# Altium footprint library domino-rising-cage-clamp.PcbLib: 435 footprints (part 25 of 28)
Each footprint in its own frame and in the unit in brackets; x right, y up, seen from the top. Pads: shape width x height; smd on the part's side, far side on the other; paste and mask are expansions set on the pad; w line width, h text height; cw(c..) or ccw(c..) is an arc to the next point about the centre after c.
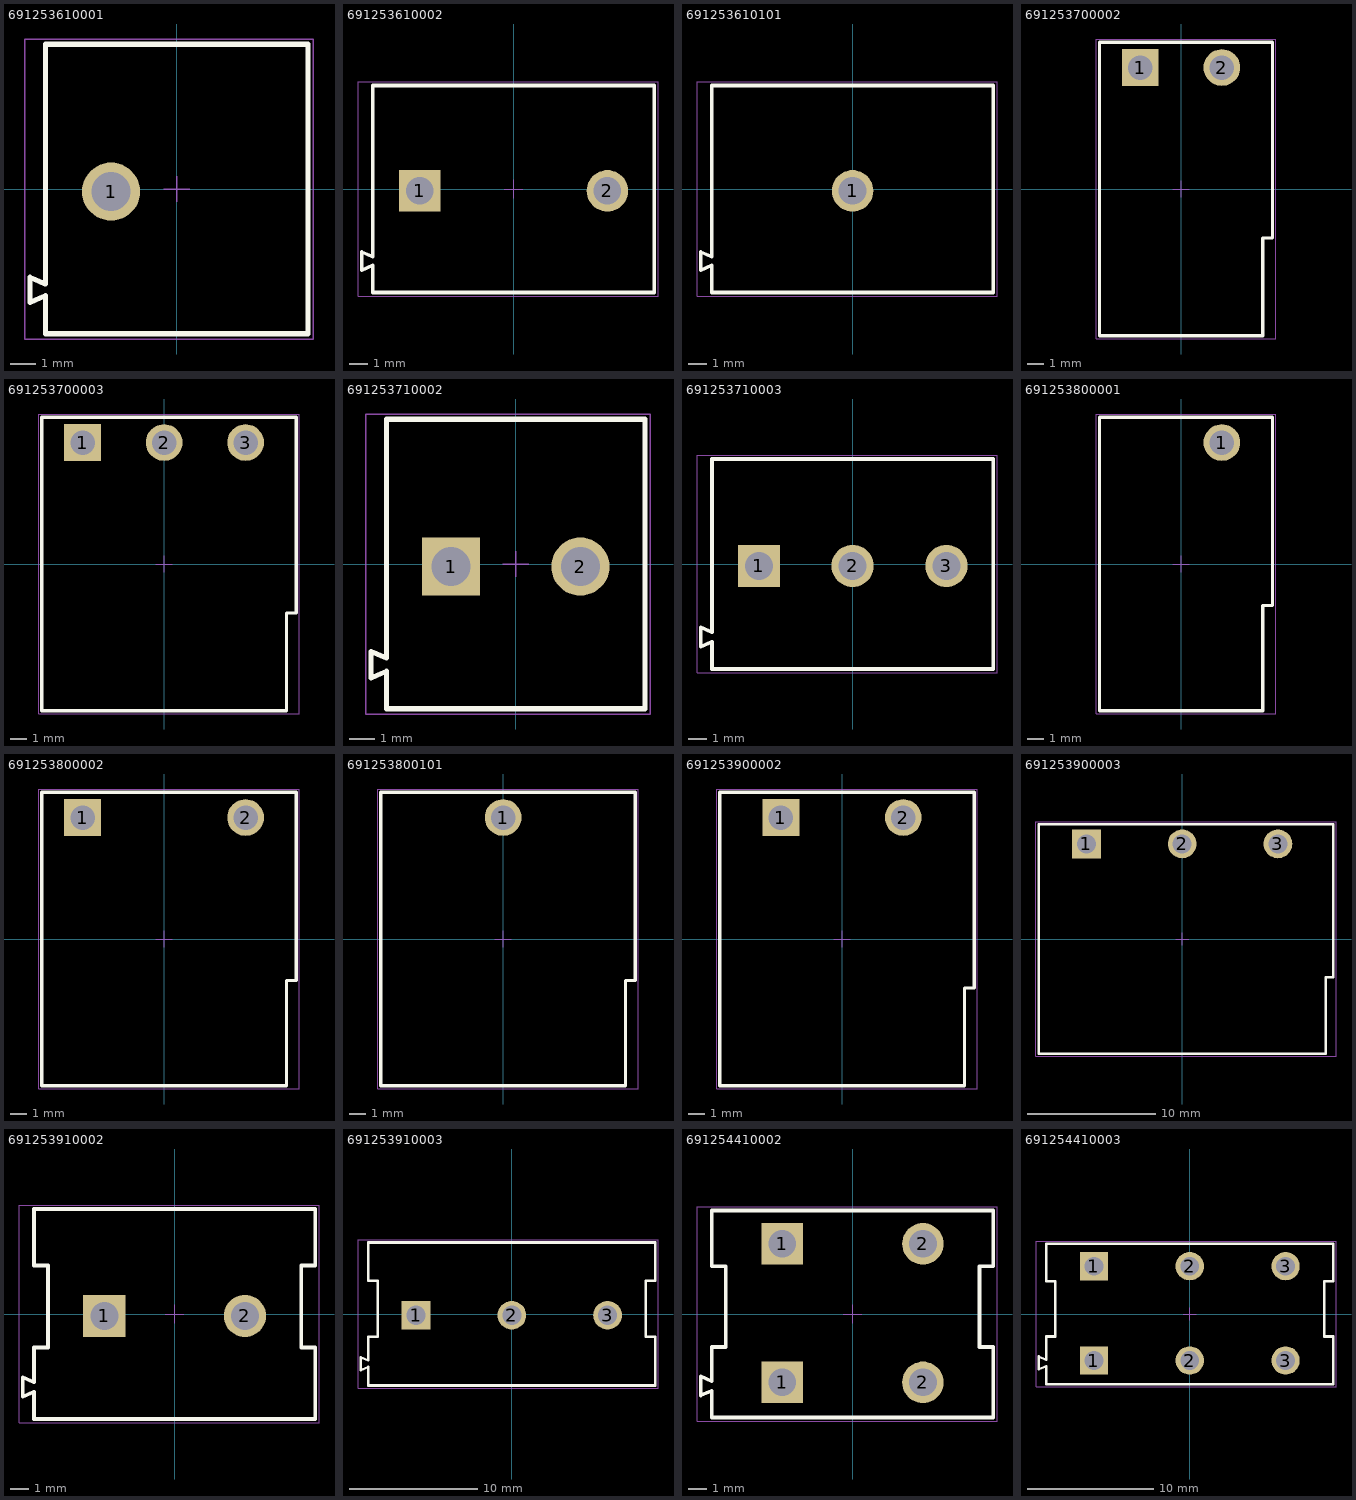
[diagram p24: the footprints below, top view; thin cyan lines are the x and y axes]

## 691253610001 [mm] "Serie 2536 - 10.16 mm _ 1 pins"
height 18
pads (1):
  round 2.25 hole 1.5: 1(-2.54,-0.1)
Top Overlay:
  lines w0.2: -5.079,-4.131 -5.68,-4.39 -5.68,-3.41 -5.079,-3.669 -5.079,5.599 5.08,5.6 5.08,-5.6 -5.08,-5.6 -5.08,-4.13
Mechanical 13:
  lines w0.1: -5.079,-4.131 -5.68,-4.39 -5.68,-3.41 -5.079,-3.669 -5.079,5.599 5.08,5.6 5.08,-5.6 -5.08,-5.6 -5.08,-4.13
Mechanical 15:
  lines w0.05: -0.5,0 0.5,0 ; 0,-0.5 0,0.5 ; -5.88,-5.8 -5.88,5.8 5.28,5.8 5.28,-5.8 -5.88,-5.8
3D body "691253610001.stp": height 18.1, standoff -3.9, extent -5.66,-5.6 5.1,5.6

## 691253610002 [mm] "Serie 2536 - 10.16 mm _ 2 pins"
height 18
pads (2):
  rect 2.25x2.25 hole 1.5: 1(-5.08,-0.1)
  round 2.25 hole 1.5: 2(5.08,-0.1)
Top Overlay:
  lines w0.2: -7.619,-4.131 -8.22,-4.39 -8.22,-3.41 -7.619,-3.669 -7.619,5.599 7.62,5.6 7.62,-5.6 -7.62,-5.6 -7.62,-4.13
Mechanical 13:
  lines w0.1: -7.619,-4.131 -8.22,-4.39 -8.22,-3.41 -7.619,-3.669 -7.619,5.599 7.62,5.6 7.62,-5.6 -7.62,-5.6 -7.62,-4.13
Mechanical 15:
  lines w0.05: -0.5,0 0.5,0 ; 0,-0.5 0,0.5 ; -8.42,-5.8 -8.42,5.8 7.82,5.8 7.82,-5.8 -8.42,-5.8
3D body "691253610002.stp": height 18.1, standoff -3.9, extent -8.2,-5.6 7.64,5.6

## 691253610101 [mm] "Serie 2536 - 10.16 mm _ 1 pin"
height 18
pads (1):
  round 2.25 hole 1.5: 1(0,-0.1)
Top Overlay:
  lines w0.2: -7.619,-4.131 -8.22,-4.39 -8.22,-3.41 -7.619,-3.669 -7.619,5.599 7.62,5.6 7.62,-5.6 -7.62,-5.6 -7.62,-4.13
Mechanical 13:
  lines w0.1: -7.619,-4.131 -8.22,-4.39 -8.22,-3.41 -7.619,-3.669 -7.619,5.599 7.62,5.6 7.62,-5.6 -7.62,-5.6 -7.62,-4.13
Mechanical 15:
  lines w0.05: -0.5,0 0.5,0 ; 0,-0.5 0,0.5 ; -8.42,-5.8 7.82,-5.8 7.82,5.8 -8.42,5.8 -8.42,-5.8
3D body "691253610101.stp": height 18.1, standoff -3.9, extent -8.22,-5.6 7.62,5.6

## 691253700002 [mm] "Serie 2537 - 5.00 mm _ 2 pins"
height 18
pads (2):
  rect 2.25x2.25 hole 1.5: 1(-2.5,7.45)
  round 2.25 hole 1.5: 2(2.5,7.45)
Top Overlay:
  lines w0.2: -5,-9 -5,9 5.6,9 5.6,-3 5,-3 5,-9 -5,-9
Mechanical 13:
  lines w0.1: -5,-9 5,-9 5,-3 5.6,-3 5.6,9 -5,9 -5,-9
Mechanical 15:
  lines w0.05: -0.5,0 0.5,0 ; 0,-0.5 0,0.5 ; -5.2,-9.2 -5.2,9.2 5.8,9.2 5.8,-9.2 -5.2,-9.2
3D body "691253700002.stp": height 11.3, standoff -3.9, extent -5,-9 5.6,9

## 691253700003 [mm] "Serie 2537 - 5.00 mm _ 3 pins"
height 18
pads (3):
  rect 2.25x2.25 hole 1.5: 1(-5,7.45)
  round 2.25 hole 1.5: 2(0,7.45) 3(5,7.45)
Top Overlay:
  lines w0.2: -7.5,-9 7.5,-9 7.5,-3 8.1,-3 8.1,9 -7.5,9 -7.5,-9
Mechanical 13:
  lines w0.1: -7.5,-9 -7.5,9 8.1,9 8.1,-3 7.5,-3 7.5,-9 -7.5,-9
Mechanical 15:
  lines w0.05: -0.5,0 0.5,0 ; 0,-0.5 0,0.5 ; -7.7,-9.2 8.3,-9.2 8.3,9.2 -7.7,9.2 -7.7,-9.2
3D body "691253700003.stp": height 11.3, standoff -3.9, extent -7.5,-9 8.1,9

## 691253710002 [mm] "Serie 2537 - 5.00 mm _ 2 pins"
height 18
pads (2):
  rect 2.25x2.25 hole 1.5: 1(-2.5,-0.1)
  round 2.25 hole 1.5: 2(2.5,-0.1)
Top Overlay:
  lines w0.2: -5.6,-4.41 -5,-4.15 -5,-5.6 5,-5.6 5,5.6 -5,5.6 -5,-3.64 -5.6,-3.38 -5.6,-4.41
Mechanical 13:
  lines w0.1: -5.6,-4.41 -5.6,-3.38 -5,-3.64 -5,5.6 5,5.6 5,-5.6 -5,-5.6 -5,-4.15 -5.6,-4.41
Mechanical 15:
  lines w0.05: -0.5,0 0.5,0 ; 0,-0.5 0,0.5 ; -5.8,-5.8 -5.8,5.8 5.2,5.8 5.2,-5.8 -5.8,-5.8
3D body "691253710002.stp": height 18.1, standoff -3.9, extent -5.6,-5.6 5,5.6

## 691253710003 [mm] "Serie 2537 - 5.00 mm _ 3 pins"
height 18
pads (3):
  rect 2.25x2.25 hole 1.5: 1(-5,-0.1)
  round 2.25 hole 1.5: 2(0,-0.1) 3(5,-0.1)
Top Overlay:
  lines w0.2: -8.1,-4.41 -8.1,-3.38 -7.5,-3.64 -7.5,5.6 7.5,5.6 7.5,-5.6 -7.5,-5.6 -7.5,-4.15 -8.1,-4.41
Mechanical 13:
  lines w0.1: -8.1,-4.41 -7.5,-4.15 -7.5,-5.6 7.5,-5.6 7.5,5.6 -7.5,5.6 -7.5,-3.64 -8.1,-3.38 -8.1,-4.41
Mechanical 15:
  lines w0.05: -0.5,0 0.5,0 ; 0,-0.5 0,0.5 ; -8.3,-5.8 7.7,-5.8 7.7,5.8 -8.3,5.8 -8.3,-5.8
3D body "691253710003.stp": height 18.1, standoff -3.9, extent -8.1,-5.6 7.5,5.6

## 691253800001 [mm] "Serie 2538 - 10.00 mm _ 1 pin"
height 11.2
pads (1):
  round 2.25 hole 1.5: 1(2.5,7.45)
Top Overlay:
  lines w0.2: -5,-9 -5,9 5.6,9 5.6,-2.55 5,-2.55 5,-9 -5,-9
Mechanical 13:
  lines w0.1: -5,-9 5,-9 5,-2.55 5.6,-2.55 5.6,9 -5,9 -5,-9
Mechanical 15:
  lines w0.05: -0.5,0 0.5,0 ; 0,-0.5 0,0.5 ; -5.2,-9.2 5.8,-9.2 5.8,9.2 -5.2,9.2 -5.2,-9.2
3D body "691253800001.stp": height 11.35, standoff -3.85, extent -5,-9 5.6,9

## 691253800002 [mm] "Serie 2538 - 10.00 mm _ 2 pins"
height 11.2
pads (2):
  rect 2.25x2.25 hole 1.5: 1(-5,7.45)
  round 2.25 hole 1.5: 2(5,7.45)
Top Overlay:
  lines w0.2: -7.5,-9 -7.5,9 8.1,9 8.1,-2.55 7.5,-2.55 7.5,-9 -7.5,-9
Mechanical 13:
  lines w0.1: -7.5,-9 7.5,-9 7.5,-2.55 8.1,-2.55 8.1,9 -7.5,9 -7.5,-9
Mechanical 15:
  lines w0.05: -0.5,0 0.5,0 ; 0,-0.5 0,0.5 ; -7.7,-9.2 8.3,-9.2 8.3,9.2 -7.7,9.2 -7.7,-9.2
3D body "691253800002.stp": height 11.35, standoff -3.85, extent -7.5,-9 8.1,9

## 691253800101 [mm] "Serie 2538 - 10.00 mm _ 1 pin"
height 11.2
pads (1):
  round 2.25 hole 1.5: 1(0,7.45)
Top Overlay:
  lines w0.2: -7.5,-9 -7.5,9 8.1,9 8.1,-2.55 7.5,-2.55 7.5,-9 -7.5,-9
Mechanical 13:
  lines w0.1: -7.5,-9 7.5,-9 7.5,-2.55 8.1,-2.55 8.1,9 -7.5,9 -7.5,-9
Mechanical 15:
  lines w0.05: -0.5,0 0.5,0 ; 0,-0.5 0,0.5 ; -7.7,-9.2 8.3,-9.2 8.3,9.2 -7.7,9.2 -7.7,-9.2
3D body "691253800101.stp": height 11.35, standoff -3.85, extent -7.5,-9 8.1,9

## 691253900002 [mm] "Serie 2539 - 7.50 mm _ 2 pins"
height 11.2
pads (2):
  rect 2.25x2.25 hole 1.5: 1(-3.75,7.45)
  round 2.25 hole 1.5: 2(3.75,7.45)
Top Overlay:
  lines w0.2: -7.5,-9 -7.5,9 8.1,9 8.1,-3 7.5,-3 7.5,-9 -7.5,-9
Mechanical 13:
  lines w0.1: -7.5,-9 7.5,-9 7.5,-3 8.1,-3 8.1,9 -7.5,9 -7.5,-9
Mechanical 15:
  lines w0.05: -0.5,0 0.5,0 ; 0,-0.5 0,0.5 ; -7.7,-9.2 -7.7,9.2 8.3,9.2 8.3,-9.2 -7.7,-9.2
3D body "691253900002.stp": height 11.35, standoff -3.85, extent -7.5,-9 8.1,9

## 691253900003 [mm] "Serie 2539 - 7.50 mm _ 3 pins"
height 11.2
pads (3):
  rect 2.25x2.25 hole 1.5: 1(-7.5,7.45)
  round 2.25 hole 1.5: 2(0,7.45) 3(7.5,7.45)
Top Overlay:
  lines w0.2: -11.25,-9 11.25,-9 11.25,-3 11.85,-3 11.85,9 -11.25,9 -11.25,-9
Mechanical 13:
  lines w0.1: -11.25,-9 -11.25,9 11.85,9 11.85,-3 11.25,-3 11.25,-9 -11.25,-9
Mechanical 15:
  lines w0.05: -0.5,0 0.5,0 ; 0,-0.5 0,0.5 ; -11.45,-9.2 12.05,-9.2 12.05,9.2 -11.45,9.2 -11.45,-9.2
3D body "691253900003.stp": height 11.35, standoff -3.85, extent -11.25,-9 11.85,9

## 691253910002 [mm] "Serie 2539 - 7.50 mm _ 2 pins"
height 18
pads (2):
  rect 2.25x2.25 hole 1.5: 1(-3.75,-0.1)
  round 2.25 hole 1.5: 2(3.75,-0.1)
Top Overlay:
  lines w0.2: -8.1,-4.41 -7.5,-4.15 -7.5,-5.6 7.5,-5.6 7.5,-1.79 6.75,-1.79 6.75,2.59 7.5,2.59 7.5,5.6 -7.5,5.6 -7.5,2.59 -6.75,2.59 -6.75,-1.79 -7.5,-1.79 -7.5,-3.64 -8.1,-3.38 -8.1,-4.41
Mechanical 13:
  lines w0.1: -8.1,-4.41 -8.1,-3.38 -7.5,-3.64 -7.5,-1.79 -6.75,-1.79 -6.75,2.59 -7.5,2.59 -7.5,5.6 7.5,5.6 7.5,2.59 6.75,2.59 6.75,-1.79 7.5,-1.79 7.5,-5.6 -7.5,-5.6 -7.5,-4.15 -8.1,-4.41
Mechanical 15:
  lines w0.05: -0.5,0 0.5,0 ; 0,-0.5 0,0.5 ; -8.3,-5.8 7.7,-5.8 7.7,5.8 -8.3,5.8 -8.3,-5.8
3D body "691253910002.stp": height 18.1, standoff -3.9, extent -8.1,-5.6 7.5,5.6

## 691253910003 [mm] "Serie 2539 - 7.50 mm _ 3 pins"
height 18
pads (3):
  rect 2.25x2.25 hole 1.5: 1(-7.5,-0.1)
  round 2.25 hole 1.5: 2(0,-0.1) 3(7.5,-0.1)
Top Overlay:
  lines w0.2: -11.85,-4.41 -11.25,-4.15 -11.25,-5.6 11.25,-5.6 11.25,-1.79 10.5,-1.79 10.5,2.59 11.25,2.59 11.25,5.6 -11.25,5.6 -11.25,2.59 -10.5,2.59 -10.5,-1.79 -11.25,-1.79 -11.25,-3.64 -11.85,-3.38 -11.85,-4.41
Mechanical 13:
  lines w0.1: -11.85,-4.41 -11.85,-3.38 -11.25,-3.64 -11.25,-1.79 -10.5,-1.79 -10.5,2.59 -11.25,2.59 -11.25,5.6 11.25,5.6 11.25,2.59 10.5,2.59 10.5,-1.79 11.25,-1.79 11.25,-5.6 -11.25,-5.6 -11.25,-4.15 -11.85,-4.41
Mechanical 15:
  lines w0.05: -0.5,0 0.5,0 ; 0,-0.5 0,0.5 ; -12.05,-5.8 11.45,-5.8 11.45,5.8 -12.05,5.8 -12.05,-5.8
3D body "691253910003.stp": height 18.1, standoff -3.9, extent -11.85,-5.6 11.25,5.6

## 691254410002 [mm] "Serie 2544 - 7.62 mm _ 2 pins"
height 18
pads (4):
  rect 2.25x2.25 hole 1.5: 1(-3.81,-3.7) 1(-3.81,3.8)
  round 2.25 hole 1.5: 2(3.81,-3.7) 2(3.81,3.8)
Top Overlay:
  lines w0.2: -7.62,5.6 7.62,5.6 7.62,2.59 6.87,2.59 6.87,-1.79 7.62,-1.79 7.62,-5.6 -7.62,-5.6 -7.62,-4.15 -8.22,-4.41 -8.22,-3.38 -7.62,-3.64 -7.62,-1.79 -6.87,-1.79 -6.87,2.59 -7.62,2.59 -7.62,5.6
Mechanical 13:
  lines w0.1: -7.62,5.6 7.62,5.6 7.62,2.59 6.87,2.59 6.87,-1.79 7.62,-1.79 7.62,-5.6 -7.62,-5.6 -7.62,-4.15 -8.22,-4.41 -8.22,-3.38 -7.62,-3.64 -7.62,-1.79 -6.87,-1.79 -6.87,2.59 -7.62,2.59 -7.62,5.6
Mechanical 15:
  lines w0.05: -0.5,0 0.5,0 ; 0,-0.5 0,0.5 ; -8.42,-5.8 7.82,-5.8 7.82,5.8 -8.42,5.8 -8.42,-5.8
3D body "691254410002.stp": height 18.05, standoff -3.45, extent -8.22,-5.6 7.62,5.6

## 691254410003 [mm] "Serie 2544 - 7.62 mm _ 3 pins"
height 18
pads (6):
  rect 2.25x2.25 hole 1.5: 1(-7.62,-3.7) 1(-7.62,3.8)
  round 2.25 hole 1.5: 2(0,-3.7) 2(0,3.8) 3(7.62,-3.7) 3(7.62,3.8)
Top Overlay:
  lines w0.2: -11.43,5.6 11.43,5.6 11.43,2.59 10.68,2.59 10.68,-1.79 11.43,-1.79 11.43,-5.6 -11.43,-5.6 -11.43,-4.15 -12.03,-4.41 -12.03,-3.38 -11.43,-3.64 -11.43,-1.79 -10.68,-1.79 -10.68,2.59 -11.43,2.59 -11.43,5.6
Mechanical 13:
  lines w0.1: -11.43,5.6 11.43,5.6 11.43,2.59 10.68,2.59 10.68,-1.79 11.43,-1.79 11.43,-5.6 -11.43,-5.6 -11.43,-4.15 -12.03,-4.41 -12.03,-3.38 -11.43,-3.64 -11.43,-1.79 -10.68,-1.79 -10.68,2.59 -11.43,2.59 -11.43,5.6
Mechanical 15:
  lines w0.05: -0.5,0 0.5,0 ; 0,-0.5 0,0.5 ; -12.23,-5.8 11.63,-5.8 11.63,5.8 -12.23,5.8 -12.23,-5.8
3D body "691254410003.stp": height 18.05, standoff -3.45, extent -12.03,-5.6 11.43,5.6